# Altium schematic symbol library LATTICEPLDS_Library.SchLib: 291 symbols (part 27 of 32) (continued)
## LFSC/M25-F900/FN900 (continued)
part E pins: AB16 VCCIO4 (power), AB17 VCCIO4 (power), AB18 VCCIO4 (power), AB19 VCCIO4 (power), AB20 VCCIO4 (power), AC17 VCCAUX4 (power), AC18 VCCAUX4 (power), AC19 VCCAUX4 (power), AC20 VCCIO4 (power), AC21 VCCIO4 (power), AC22 VCCIO4 (power), AD17 VCCAUX4 (power), AD18 VCCAUX4 (power), AD19 VCCAUX4 (power), AD20 VCCIO4 (power), AD21 VCCIO4 (power), AD22 VCCIO4 (power), AD23 PB57A, AD24 VTT_4, AD25 PB68D, AE16 PB38C, AE17 VTT_4, AE18 VTT_4, AE19 PB52C, AE20 PB52D, AE21 PB53A, AE22 PB60C, AE23 PB57B, AE24 PB67C, AE25 PB67D, AE26 PB68C, AF16 PB38D, AF17 PB42C, AF18 PB47A, AF19 PB49D, AF21 PB53B, AF24 PB63A, AF25 PB64B, AF27 PB65B, AG16 PB39B, AG17 PB42D, AG18 PB47B, AG19 PB49C, AG20 VCCIO4 (power), AG21 PB55A, AG22 PB55B, AG23 VCCIO4 (power), AG24 PB63B, AG25 PB64A, AG26 PB65A, AG28 PB69C, AG29 PB69D, AH16 PB39A, AH17 PB42A, AH18 PB42B, AH19 PB51C, AH20 PB51D, AH21 PB56C, AH22 PB56A, AH23 PB56B, AH24 PB59A, AH25 PB59B, AH26 PB61A, AH27 PB61B, AH28 PB67B, AH29 PB68B, AH30 PB69B, AJ16 PB38A, AJ17 PB38B, AJ18 PB43A, AJ19 PB43B, AJ20 PB49A, AJ21 PB49B, AJ23 VCCIO4 (power), AJ26 VCCIO4 (power), AJ28 PB67A, AJ29 PB68A, AJ30 PB69A, AK16 PB37A, AK17 PB37B, AK18 PB41A, AK19 PB41B, AK20 PB46A, AK21 PB46B, AK22 PB51A, AK23 PB51B, AK24 PB52A, AK25 PB52B, AK28 PB60A, AK29 PB60B
part F pins: AB11 VCCIO5 (power), AB12 VCCIO5 (power), AB13 VCCIO5 (power), AB14 VCCIO5 (power), AB15 VCCIO5 (power), AC9 VCCIO5 (power), AC10 VCCIO5 (power), AC11 VCCIO5 (power), AC12 VCCAUX5 (power), AC13 VCCAUX5 (power), AC14 VCCAUX5 (power), AC15 VTT_5, AD6 PB4C, AD7 PB5C, AD8 PB5D, AD9 VCCIO5 (power), AD10 VCCIO5 (power), AD11 VCCIO5 (power), AD12 VCCAUX5 (power), AD13 VCCAUX5 (power), AD14 VCCAUX5 (power), AD15 PB31C, AD16 VTT_5, AE5 PB3D, AE7 VCCIO5 (power), AE9 VTT_5, AE10 PB11D, AE11 PB13A, AE12 PB15C, AE13 PB15D, AE14 PB20D, AE15 PB31D, AF4 PB3C, AF6 PB7B, AF7 PB7A, AF8 PB9A, AF9 PB11C, AF10 PB13B, AF13 PB20C, AF14 PB21C, AF15 PB21D, AG3 PB4A, AG5 PB8B, AG8 PB9B, AG11 VCCIO5 (power), AG13 PB23C, AG14 PB25B, AG15 PB29B, AH1 PB3A, AH2 PB4B, AH3 PB11A, AH4 PB8A, AH6 VCCIO5 (power), AH7 PB15A, AH8 PB15B, AH10 PB20A, AH11 PB20B, AH12 PB31A, AH13 PB23D, AH14 PB25A, AH15 PB29A, AJ1 PB3B, AJ2 PB5A, AJ3 PB11B, AJ4 PB12B, AJ5 PB17A, AJ6 PB17B, AJ7 PB19A, AJ8 PB19B, AJ9 VCCIO5 (power), AJ11 PB23A, AJ12 PB23B, AJ13 PB31B, AJ14 PB33A, AJ15 PB33B, AK2 PB5B, AK3 PB12A, AK4 PB16A, AK5 PB16B, AK6 PB21A, AK7 PB21B, AK8 PB24A, AK9 PB24B, AK10 PB28A, AK11 PB28B, AK12 PB32A, AK13 PB32B, AK14 PB35A, AK15 PB35B
part G pins: AA1 PL44B, AA2 PL47B, AA4 VCCIO6 (power), AA6 VTT_6, AA7 VCCIO6 (power), AA8 VCCIO6 (power), AB1 PL48A, AB2 VCCIO6 (power), AB5 PL51D, AB6 PL55C, AB7 VCCIO6 (power), AB8 VCCIO6 (power), AC1 PL48B, AC3 PL52A, AC4 PL53A, AC5 PL55D, AC6 PL57C, AC7 PL57D, AD1 VCCIO6 (power), AD2 PL51A, AD3 PL52B, AD4 PL53B, AD5 TEMP, AE2 PL51B, AE3 PL56A, AE4 XRES, AF1 PL55A, AF2 PL57A, AF3 PL56B, AG1 PL55B, AG2 PL57B, N1 PL29B, N2 PL29A, N3 PL30A, P1 PL34A, P2 PL31A, P3 PL30B, P4 PL30C, R1 PL34B, R2 PL31B, R3 PL31D, R4 PL34D, R5 PL34C, R6 PL29D, R7 PL29C, T1 PL38A, T2 PL35A, T3 PL31C, T4 PL39B, T5 PL39A, T6 PL35C, T7 VTT_6, T9 VCCIO6 (power), U1 PL38B, U2 PL35B, U3 PL36A, U4 PL40A, U5 PL40B, U6 PL42C, U7 VCCAUX6 (power), U8 VCCAUX6 (power), U9 VCCIO6 (power), V1 PL42A, V2 PL43A, V3 PL36B, V4 PL43D, V5 PL43C, V6 PL42D, V7 VCCAUX6 (power), V8 VCCAUX6 (power), V9 VCCIO6 (power), W1 PL42B, W2 PL43B, W3 PL47D, W4 VCCIO6 (power), W5 PL48C, W6 VTT_6, W7 VCCAUX6 (power), W8 VCCAUX6 (power), W9 VCCIO6 (power), Y1 PL44A, Y2 PL47A, Y3 PL47C, Y5 PL49A, Y6 PL49B, Y7 VCCIO6 (power), Y8 VCCIO6 (power), Y9 VCCIO6 (power)
part H pins: D1 PL22D, D2 PL16B, D3 PL16A, E1 PL22C, E2 PL17B, E3 PL17A, F1 PL22B, F2 PL22A, F3 PL18A, G1 PL20B, G2 PL20A, G3 PL18B, H2 VCCIO7 (power), H4 VCCIO7 (power), J1 PL26A, J2 VCCIO7 (power), J4 PL17D, J5 PL16D, J6 PL16C, J7 VCCIO7 (power), J8 VCCIO7 (power), K1 PL26B, K3 PL25A, K4 PL17C, K5 PL18C, K6 PL18D, K7 VCCIO7 (power), K8 VCCIO7 (power), L1 PL27A, L2 VCCIO7 (power), L3 PL25B, L5 PL21A, L6 PL25C, L7 VTT_7, L8 VCCIO7 (power), L9 VCCIO7 (power), M1 PL27B, M5 PL21B, M6 PL25D, M7 VCCAUX7 (power), M8 VCCAUX7 (power), M9 VCCIO7 (power), N4 VCCIO7 (power), N6 VCCIO7 (power), N7 VCCAUX7 (power), N8 VCCAUX7 (power), N9 VCCIO7 (power), P7 VTT_7, P8 PL27C, P9 VCCIO7 (power), R8 PL27D, R9 VCCIO7 (power)
part I pins: G24 TDI, G25 TCK, H25 TDO, J25 VCCJ (power), J26 TMS
part J pins: A2 RESP_ULC, A3 A_HDOUTP0_L, A4 A_HDOUTN0_L, A5 A_HDOUTN1_L, A6 A_HDOUTP1_L, A7 A_HDOUTP2_L, A8 A_HDOUTN2_L, A9 A_HDOUTN3_L, A10 A_HDOUTP3_L, B1 A_REFCLKP_L, B3 A_HDINP0_L, B4 A_HDINN0_L, B5 A_HDINN1_L, B6 A_HDINP1_L, B7 A_HDINP2_L, B8 A_HDINN2_L, B9 A_HDINN3_L, B10 A_HDINP3_L, C1 A_REFCLKN_L, C2 RESPN_ULC, C3 A_VDDIB0_L, C4 A_VDDOB0_L, C5 A_VDDOB1_L, C6 A_VDDIB1_L, C7 A_VDDIB2_L, C8 A_VDDOB2_L, C9 A_VDDOB3_L, C10 A_VDDIB3_L, D6 A_VDDRX0_L, D8 A_VDDRX2_L, E7 A_VDDRX1_L, E9 A_VDDRX3_L, F7 A_VDDAX25_L
part K pins: A1 GND (power), A11 UNUSED, A12 GND (power), A30 GND (power), AA3 GND (power), AA5 GND (power), AA9 VCC (power), AA10 VCC (power), AA11 VCC (power), AA12 VCC (power), AA13 VCC (power), AA14 VCC (power), AA15 GND (power), AA16 GND (power), AA17 VCC (power), AA18 VCC (power), AA19 VCC (power), AA20 VCC (power), AA21 VCC (power), AA22 VCC (power), AA27 GND (power), AA28 UNUSED, AB3 UNUSED, AB4 GND (power), AB9 VCC12 (power), AB10 VCC (power), AB21 VCC (power), AB22 VCC12 (power), AB29 GND (power), AB30 UNUSED, AC2 GND (power), AC8 VCC12 (power), AC16 UNUSED, AC23 VCC12 (power), AC30 GND (power), AE1 GND (power), AE6 GND (power), AE8 GND (power), AE27 GND (power), AF5 VCC12 (power), AF11 GND (power), AF12 UNUSED, AF20 GND (power), AF22 GND (power), AF23 GND (power), AF26 VCC12 (power), AG4 VCC12 (power), AG6 GND (power), AG7 UNUSED, AG9 GND (power), AG10 UNUSED, AG12 GND (power), AG27 VCC12 (power), AH5 GND (power), AH9 UNUSED, AJ10 GND (power), AJ22 GND (power), AJ24 UNUSED, AJ25 GND (power), AJ27 GND (power), AK1 GND (power), AK26 GND (power), AK27 UNUSED, AK30 GND (power), B2 UNUSED, B29 UNUSED, C11 GND (power), C20 GND (power), D4 VCC12 (power), D5 VCC12 (power), D7 VCC12 (power), D9 VCC12 (power), D10 GND (power), D11 GND (power), D20 GND (power), D21 GND (power), D22 VCC12 (power), D24 VCC12 (power), D26 VCC12 (power), D27 VCC12 (power), E5 VCC12 (power), E6 VCC12 (power), E8 VCC12 (power), E10 GND (power), E11 GND (power), E18 GND (power), E19 UNUSED, E20 GND (power), E21 GND (power), E23 VCC12 (power), E25 VCC12 (power), E26 VCC12 (power), E27 GND (power), F8 GND (power), F9 UNUSED, F10 GND (power), F21 GND (power), F23 GND (power), F27 GND (power), F30 GND (power), G4 GND (power), G7 UNUSED, G8 GND (power), G19 UNUSED, G20 UNUSED, G21 UNUSED, G23 GND (power), H1 GND (power), H3 GND (power), H7 GND (power), H8 VCC12 (power), H15 VCC12 (power), H23 VCC12 (power), H29 GND (power), J3 UNUSED, J9 VCC (power), J10 VCC (power), J21 VCC (power), J22 VCC (power), J27 GND (power), K2 GND (power), K9 VCC (power), K10 VCC (power), K11 VCC (power), K12 VCC (power), K13 VCC (power), K14 VCC (power), K15 GND (power), K16 GND (power), K17 VCC (power), K18 VCC (power), K19 VCC (power), K20 VCC (power), K21 VCC (power), K22 VCC (power), K28 UNUSED, K29 GND (power), L4 GND (power), L10 VCC (power), L11 GND (power), L12 GND (power), L13 GND (power), L14 GND (power), L15 GND (power), L16 GND (power), L17 GND (power), L18 GND (power), L19 GND (power), L20 GND (power), L21 VCC (power), L28 UNUSED, M2 GND (power), M3 GND (power), M4 UNUSED, M10 VCC (power), M11 GND (power), M12 GND (power), M13 GND (power), M14 GND (power), M15 GND (power), M16 GND (power), M17 GND (power), M18 GND (power), M19 GND (power), M20 GND (power), M21 VCC (power), M28 GND (power), N5 GND (power), N10 VCC (power), N11 GND (power), N12 GND (power), N13 GND (power), N14 GND (power), N15 GND (power), N16 GND (power), N17 GND (power), N18 GND (power), N19 GND (power), N20 GND (power), N21 VCC (power), N26 GND (power), P5 UNUSED, P6 GND (power), P10 VCC (power), P11 GND (power), P12 GND (power), P13 GND (power), P14 GND (power), P15 GND (power), P16 GND (power), P17 GND (power), P18 GND (power), P19 GND (power), P20 GND (power), P21 VCC (power), P23 UNUSED, P24 UNUSED, P25 GND (power), R10 GND (power), R11 GND (power), R12 GND (power), R13 GND (power), R14 GND (power), R15 GND (power), R16 GND (power), R17 GND (power), R18 GND (power), R19 GND (power), R20 GND (power), R21 GND (power), R23 VCC12 (power), R24 GND (power), T8 VCC12 (power), T10 GND (power), T11 GND (power), T12 GND (power), T13 GND (power), T14 GND (power), T15 GND (power), T16 GND (power), T17 GND (power), T18 GND (power), T19 GND (power), T20 GND (power), T21 GND (power), U10 VCC (power), U11 GND (power), U12 GND (power), U13 GND (power), U14 GND (power), U15 GND (power), U16 GND (power), U17 GND (power), U18 GND (power), U19 GND (power), U20 GND (power), U21 VCC (power), V10 VCC (power), V11 GND (power), V12 GND (power), V13 GND (power), V14 GND (power), V15 GND (power), V16 GND (power), V17 GND (power), V18 GND (power), V19 GND (power), V20 GND (power), V21 VCC (power), W10 VCC (power), W11 GND (power), W12 GND (power), W13 GND (power), W14 GND (power), W15 GND (power), W16 GND (power), W17 GND (power), W18 GND (power), W19 GND (power), W20 GND (power), W21 VCC (power), Y4 GND (power), Y10 VCC (power), Y11 GND (power), Y12 GND (power), Y13 GND (power), Y14 GND (power), Y15 GND (power), Y16 GND (power), Y17 GND (power), Y18 GND (power), Y19 GND (power), Y20 GND (power), Y21 VCC (power), Y26 GND (power), Y29 GND (power)

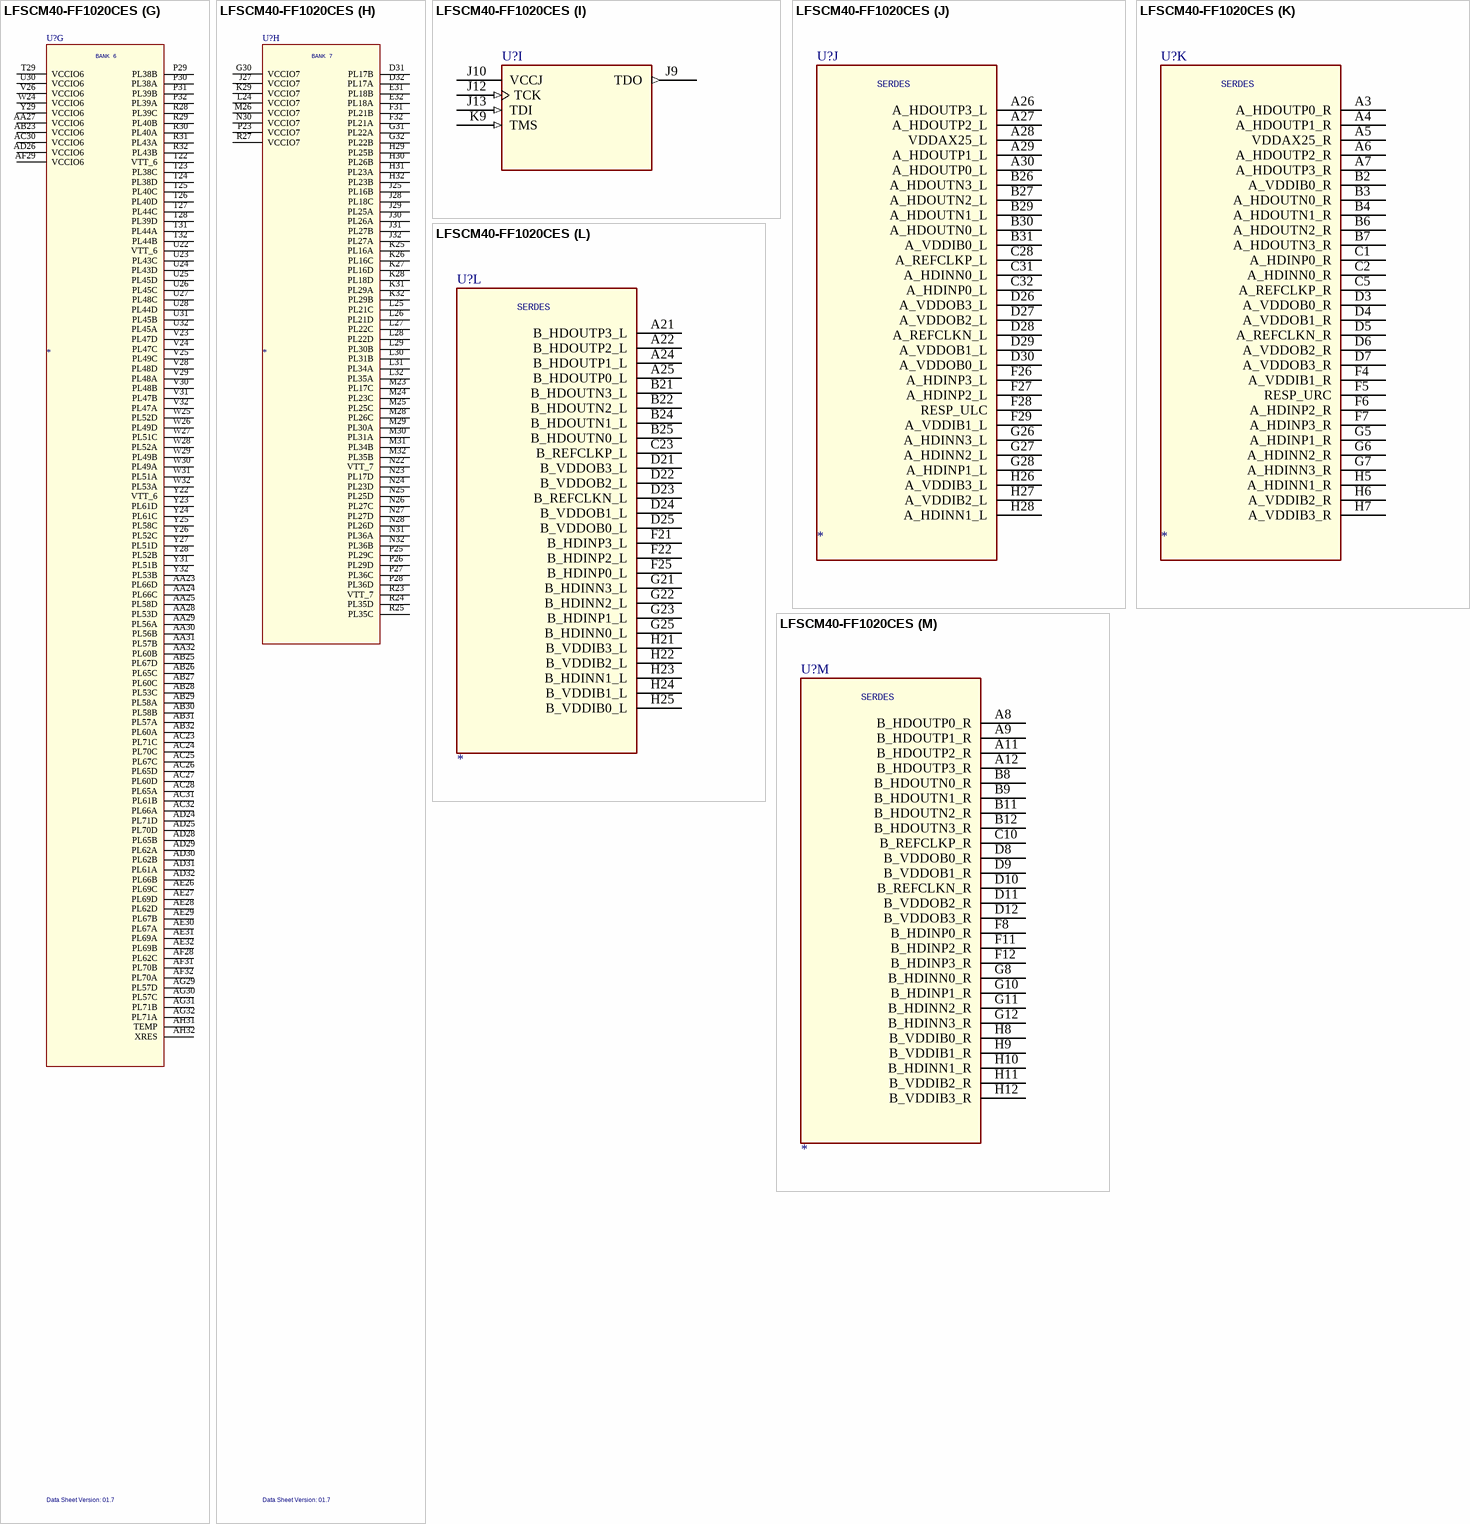
[diagram p248: symbol LFSCM40-FF1020CES]

## LFSCM40-FF1020CES
designator U?  Data Sheet Version: 01.7
SPLIT_INST: TRUE; SWAP_INFO: (S1+S2+S3+S4+S5+S6+S7+S8+S9+S10+S11+S12+S13)
part A pins: A2 GND (power), A10 GND (power), A23 GND (power), A31 GND (power), AA6 GND (power), AA11 VCCAUX (power), AA12 VCCAUX (power), AA13 GND (power), AA14 VCC12 (power), AA15 GND (power), AA16 VCC12 (power), AA17 VCC12 (power), AA18 GND (power), AA19 VCC12 (power), AA20 GND (power), AA21 VCCAUX (power), AA22 VCCAUX (power), AA26 GND (power), AB10 GND (power), AB11 VCCAUX (power), AB12 VCCAUX (power), AB15 VCCAUX (power), AB16 VCCAUX (power), AB17 VCCAUX (power), AB18 VCCAUX (power), AB21 VCCAUX (power), AB22 VCCAUX (power), AB24 GND (power), AC3 GND (power), AC14 GND (power), AC22 GND (power), AC29 GND (power), AD7 GND (power), AD11 GND (power), AD19 GND (power), AD27 GND (power), AF4 GND (power), AF12 GND (power), AF18 GND (power), AF24 GND (power), AF30 GND (power), AG9 GND (power), AG15 GND (power), AG21 GND (power), AJ4 GND (power), AJ10 GND (power), AJ16 GND (power), AJ20 GND (power), AJ26 GND (power), AJ29 GND (power), AK7 GND (power), AK13 GND (power), AK17 GND (power), AK23 GND (power), AL1 GND (power), AL32 GND (power), AM2 GND (power), AM31 GND (power), B1 GND (power), B5 VCC12 (power), B10 VCC12 (power), B23 VCC12 (power), B28 VCC12 (power), B32 GND (power), C3 GND (power), C4 GND (power), C6 GND (power), C7 GND (power), C8 GND (power), C9 GND (power), C11 GND (power), C12 GND (power), C16 GND (power), C21 GND (power), C22 GND (power), C24 GND (power), C25 GND (power), C26 GND (power), C27 GND (power), C29 GND (power), C30 GND (power), D17 GND (power), E4 VCC12 (power), E5 UNUSED, E7 VCC12 (power), E9 VCC12 (power), E10 UNUSED, E12 VCC12 (power), E21 VCC12 (power), E23 UNUSED, E24 VCC12 (power), E26 VCC12 (power), E28 UNUSED, E29 VCC12 (power), F3 GND (power), F9 GND (power), F10 UNUSED, F18 GND (power), F23 UNUSED, F30 GND (power), G3 GND (power), G15 GND (power), G24 GND (power), G29 GND (power), J6 GND (power), J14 GND (power), J22 GND (power), J26 GND (power), K4 GND (power), K11 GND (power), K19 GND (power), K30 GND (power), L9 GND (power), L11 VCCAUX (power), L12 VCCAUX (power), L14 VCCAUX (power), L15 VCCAUX (power), L18 VCCAUX (power), L19 VCCAUX (power), L21 VCCAUX (power), L22 VCCAUX (power), L23 GND (power), M7 GND (power), M11 VCCAUX (power), M12 VCCAUX (power), M13 GND (power), M14 VCC12 (power), M15 GND (power), M16 VCC12 (power), M17 VCC12 (power), M18 GND (power), M19 VCC12 (power), M20 GND (power), M21 VCCAUX (power), M22 VCCAUX (power), M27 GND (power), N3 GND (power), N12 GND (power), N13 VCC (power), N14 GND (power), N15 VCC (power), N16 VCC (power), N17 VCC (power), N18 VCC (power), N19 GND (power), N20 VCC (power), N21 GND (power), N29 GND (power), P10 GND (power), P11 VCCAUX (power), P12 VCC12 (power), P13 GND (power), P14 VCC (power), P15 GND (power), P16 VCC (power), P17 VCC (power), P18 GND (power), P19 VCC (power), P20 GND (power), P21 VCC12 (power), P22 VCCAUX (power), P24 GND (power), R6 GND (power), R11 VCCAUX (power), R12 GND (power), R13 VCC (power), R14 GND (power), R15 VCC (power), R16 GND (power), R17 GND (power), R18 VCC (power), R19 GND (power), R20 VCC (power), R21 GND (power), R22 VCCAUX (power), R26 GND (power), T4 GND (power), T12 VCC12 (power), T13 VCC (power), T14 VCC (power), T15 GND (power), T16 VCC (power), T17 VCC (power), T18 GND (power), T19 VCC (power), T20 VCC (power), T21 VCC12 (power), T30 GND (power), U3 GND (power), U12 VCC12 (power), U13 VCC (power), U14 VCC (power), U15 GND (power), U16 VCC (power), U17 VCC (power), U18 GND (power), U19 VCC (power), U20 VCC (power), U21 VCC12 (power), U29 GND (power), V7 GND (power), V11 VCCAUX (power), V12 GND (power), V13 VCC (power), V14 GND (power), V15 VCC (power), V16 GND (power), V17 GND (power), V18 VCC (power), V19 GND (power), V20 VCC (power), V21 GND (power), V22 VCCAUX (power), V27 GND (power), W9 GND (power), W11 VCCAUX (power), W12 VCC12 (power), W13 GND (power), W14 VCC (power), W15 GND (power), W16 VCC (power), W17 VCC (power), W18 GND (power), W19 VCC (power), W20 GND (power), W21 VCC12 (power), W22 VCCAUX (power), W23 GND (power), Y4 GND (power), Y12 GND (power), Y13 VCC (power), Y14 GND (power), Y15 VCC (power), Y16 VCC (power), Y17 VCC (power), Y18 VCC (power), Y19 GND (power), Y20 VCC (power), Y21 GND (power), Y30 GND (power)
part B pins: A13 PT47A, A14 PT47B, A15 PT45A, A16 PT45B, A17 PT43B, A18 PT43A, A19 PT41B, A20 PT41A, B13 PT51A, B14 PT51B, B15 PT46A, B16 PT46B, B17 PT42B, B18 PT42A, B19 PT37B, B20 PT37A, C13 PT53B, C14 PT53A, C15 PT50B, C17 VCCIO1 (power), C18 PT38B, C19 PT35A, C20 PT35B, D13 PT55B, D14 PT55A, D15 PT50A, D16 VCCIO1 (power), D18 PT38A, D19 PT33A, D20 PT33B, E3 A_VDDRX01_R, E6 A_VDDRX23_R, E8 B_VDDRX01_R, E11 B_VDDRX23_R, E13 PT59B, E14 PT57B, E15 PT54D, E16 PT54C, E17 PT35D, E18 PT35C, E19 PT30B, E20 PT27B, E22 B_VDDRX23_L, E25 B_VDDRX01_L, E27 A_VDDRX23_L, E30 A_VDDRX01_L, F13 PT59A, F14 PT57A, F15 VCCIO1 (power), F16 PT46C, F17 PT42D, F19 PT30A, F20 PT27A, F24 VCCIO1 (power), G9 VCCIO1 (power), G13 PT58C, G14 PT55C, G16 PT46D, G17 PT42C, G18 VCCIO1 (power), G19 PT33C, G20 PT30C, H13 PT58D, H14 PT55D, H15 PT47D, H16 PT47C, H17 PT41D, H18 PT41C, H19 PT33D, H20 PT30D, J11 VCCIO1 (power), J15 PT61D, J16 PT49B, J17 PT39B, J18 PT28D, J19 VCCIO1 (power), J20 RDCFGN, J21 RESETN, J23 M1, J24 M2, K10 CCLK, K12 PROGRAMN, K13 MPIIRQN, K14 VCCIO1 (power), K15 PT61C, K16 PT49A, K17 PT39A, K18 PT28C, K20 DONE, K21 INITN, K22 VCCIO1 (power), K23 M0, K24 M3, L13 PT50D, L16 PT45C, L17 PT43C, L20 PT39C
part C pins: D1 PR17A, D2 PR17B, E1 PR18A, E2 PR18B, F1 PR21A, F2 PR21B, G1 PR22B, G2 PR22A, G4 VCCIO2 (power), H1 PR23B, H2 PR23A, H3 PR26B, H4 PR25B, J1 PR27A, J2 PR27B, J3 PR26A, J4 PR25A, J5 PR18C, J7 VCCIO2 (power), J8 PR16B, K1 PR29B, K2 PR29A, K3 VCCIO2 (power), K5 PR18D, K6 PR16D, K7 PR16C, K8 PR16A, L1 PR35A, L2 PR34A, L3 PR31B, L4 PR30B, L5 PR22D, L6 PR22C, L7 PR21D, L8 PR21C, L10 VCCIO2 (power), M1 PR35B, M2 PR34B, M3 PR31A, M4 PR30A, M5 PR26C, M6 VCCIO2 (power), M8 PR25C, M9 PR23C, M10 PR17C, N1 PR36B, N2 PR36A, N4 VCCIO2 (power), N5 PR26D, N6 PR27D, N7 PR27C, N8 PR25D, N9 PR23D, N10 PR17D, N11 VTT_2, P5 PR36D, P6 PR36C, P7 PR29D, P8 PR29C, P9 VCCIO2 (power), R7 VCCIO2 (power), R8 PR35C, R9 PR35D, R10 VTT_2
part D pins: AA1 PR60B, AA2 PR57B, AA3 PR56B, AA4 PR56A, AA5 PR53D, AA7 VCCIO3 (power), AA8 PR58D, AA9 PR66C, AA10 PR66D, AB1 PR60A, AB2 PR57A, AB3 PR58B, AB4 PR58A, AB5 PR53C, AB6 PR60C, AB7 PR65C, AB8 PR67D, AB9 VCCIO3 (power), AC1 PR66A, AC2 PR61B, AC4 VCCIO3 (power), AC5 PR65A, AC6 PR60D, AC7 PR65D, AC8 PR67C, AC9 PR70C, AC10 PR71C, AD1 PR66B, AD2 PR61A, AD3 PR62B, AD4 PR62A, AD5 PR65B, AD6 VCCIO3 (power), AD8 PR70D, AD9 PR71D, AE1 PR69B, AE2 PR69A, AE3 PR67A, AE4 PR67B, AE5 PR62D, AE6 PR69D, AE7 PR69C, AF1 PR70A, AF2 PR70B, AF3 VCCIO3 (power), AF5 PR62C, AG1 PR71A, AG2 PR71B, AG3 PR57C, AG4 PR57D, AH1 PROBE_VCC (power), AH2 PROBE_GND, P1 PR39A, P2 PR39B, P3 PR38A, P4 PR38B, R1 PR43B, R2 PR43A, R3 PR40A, R4 PR40B, R5 PR39C, T1 PR44B, T2 PR44A, T3 VCCIO3 (power), T5 PR39D, T6 PR44C, T7 PR40D, T8 PR40C, T9 PR38D, T10 PR38C, T11 VTT_3, U1 PR45A, U2 PR45B, U4 VCCIO3 (power), U5 PR44D, U6 PR48C, U7 PR45C, U8 PR45D, U9 PR43D, U10 PR43C, U11 VTT_3, V1 PR47A, V2 PR47B, V3 PR48B, V4 PR48A, V5 PR48D, V6 VCCIO3 (power), V8 PR49C, V9 PR47C, V10 PR47D, W1 PR53A, W2 PR51A, W3 PR49A, W4 PR49B, W5 PR52A, W6 PR51C, W7 PR49D, W8 PR52D, W10 VCCIO3 (power), Y1 PR53B, Y2 PR51B, Y3 VCCIO3 (power), Y5 PR52B, Y6 PR51D, Y7 PR52C, Y8 PR58C, Y9 PR61C, Y10 PR61D, Y11 VTT_3
part E pins: AB13 VTT_4, AB14 VTT_4, AC11 VCCIO4 (power), AC12 PB70C, AC13 PB66D, AC15 VTT_4, AC16 PB46D, AD10 PB82D, AD12 PB69A, AD13 PB66C, AD14 VCCIO4 (power), AD15 PB51D, AD16 PB46C, AE8 PB83D, AE9 PB83C, AE10 PB82C, AE11 PB75D, AE12 PB69B, AE13 PB61D, AE14 PB55D, AE15 PB51C, AE16 PB45D, AF6 PB81D, AF7 PB79D, AF8 PB79C, AF9 VCCIO4 (power), AF10 PB75C, AF11 PB67C, AF13 PB61C, AF14 PB55C, AF15 VCCIO4 (power), AF16 PB45C, AG5 PB81C, AG6 PB62C, AG7 PB74A, AG8 PB74B, AG10 PB63C, AG11 PB63D, AG12 VCCIO4 (power), AG13 PB53D, AG14 PB53C, AG16 PB47C, AH3 PB85D, AH4 PB78B, AH5 PB78A, AH6 PB58D, AH7 PB58C, AH8 PB57D, AH9 PB57C, AH10 PB54D, AH11 PB54C, AH12 PB50D, AH13 PB50C, AH14 PB49D, AH15 PB49C, AH16 PB47D, AJ1 PB85A, AJ2 PB85C, AJ3 PB82B, AJ5 PB79B, AJ6 PB75B, AJ7 VCCIO4 (power), AJ8 PB67B, AJ9 PB63B, AJ11 PB58B, AJ12 PB55B, AJ13 VCCIO4 (power), AJ14 PB51B, AJ15 PB49B, AK1 PB85B, AK2 PB83B, AK3 PB82A, AK4 VCCIO4 (power), AK5 PB79A, AK6 PB75A, AK8 PB67A, AK9 PB63A, AK10 VCCIO4 (power), AK11 PB58A, AK12 PB55A, AK14 PB51A, AK15 PB49A, AK16 VCCIO4 (power), AL2 PB83A, AL3 PB81B, AL4 PB81A, AL5 PB73B, AL6 PB73A, AL7 PB66B, AL8 PB62B, AL9 PB62A, AL10 PB57B, AL11 PB57A, AL12 PB53B, AL13 PB53A, AL14 PB47B, AL15 PB46B, AL16 PB45B, AM3 PB77B, AM4 PB77A, AM5 PB70B, AM6 PB70A, AM7 PB66A, AM8 PB61B, AM9 PB61A, AM10 PB54B, AM11 PB54A, AM12 PB50B, AM13 PB50A, AM14 PB47A, AM15 PB46A, AM16 PB45A
part F pins: AB19 VTT_5, AB20 VTT_5, AC17 PB42C, AC18 VTT_5, AC19 VCCIO5 (power), AC20 PB22C, AC21 PB15C, AD17 PB42D, AD18 PB37C, AD20 PB22D, AD21 PB15D, AD22 VCCIO5 (power), AD23 PB5C, AE17 PB43C, AE18 PB37D, AE19 PB33C, AE20 PB25D, AE21 PB25C, AE22 PB13C, AE23 PB5D, AE24 PB4D, AE25 PB4C, AF17 PB43D, AF19 PB33D, AF20 PB27C, AF21 VCCIO5 (power), AF22 PB17D, AF23 PB13D, AF25 PB7D, AF26 PB7C, AF27 PB3C, AG17 PB41D, AG18 VCCIO5 (power), AG19 PB35D, AG20 PB35C, AG22 PB30C, AG23 PB17C, AG24 VCCIO5 (power), AG25 PB19B, AG26 PB19A, AG27 PB26C, AG28 PB3D, AH17 PB41C, AH18 PB39D, AH19 PB39C, AH20 PB38D, AH21 PB38C, AH22 PB30D, AH23 PB31C, AH24 PB31D, AH25 PB34C, AH26 PB34D, AH27 PB26D, AH28 PB11D, AH29 PB11C, AH30 PB9B, AJ17 VCCIO5 (power), AJ18 PB39A, AJ19 PB37A, AJ21 PB33A, AJ22 PB30A, AJ23 VCCIO5 (power), AJ24 PB25A, AJ25 PB21A, AJ27 PB13A, AJ28 PB8A, AJ30 VCCIO5 (power), AJ31 PB9A, AJ32 PB3A, AK18 PB39B, AK19 PB37B, AK20 VCCIO5 (power), AK21 PB33B, AK22 PB30B, AK24 PB25B, AK25 PB21B, AK26 VCCIO5 (power), AK27 PB13B, AK28 PB8B, AK29 PB7A, AK30 PB5A, AK31 PB4A, AK32 PB3B, AL17 PB43A, AL18 PB42A, AL19 PB41A, AL20 PB35B, AL21 PB35A, AL22 PB31B, AL23 PB31A, AL24 PB26B, AL25 PB26A, AL26 PB22A, AL27 PB15B, AL28 PB15A, AL29 PB7B, AL30 PB5B, AL31 PB4B, AM17 PB43B, AM18 PB42B, AM19 PB41B, AM20 PB38B, AM21 PB38A, AM22 PB34B, AM23 PB34A, AM24 PB27B, AM25 PB27A, AM26 PB22B, AM27 PB17B, AM28 PB17A, AM29 PB11B, AM30 PB11A
part G pins: AA23 PL66D, AA24 PL66C, AA25 PL58D, AA27 VCCIO6 (power), AA28 PL53D, AA29 PL56A, AA30 PL56B, AA31 PL57B, AA32 PL60B, AB23 VCCIO6 (power), AB25 PL67D, AB26 PL65C, AB27 PL60C, AB28 PL53C, AB29 PL58A, AB30 PL58B, AB31 PL57A, AB32 PL60A, AC23 PL71C, AC24 PL70C, AC25 PL67C, AC26 PL65D, AC27 PL60D, AC28 PL65A, AC30 VCCIO6 (power), AC31 PL61B, AC32 PL66A, AD24 PL71D, AD25 PL70D, AD26 VCCIO6 (power), AD28 PL65B, AD29 PL62A, AD30 PL62B, AD31 PL61A, AD32 PL66B, AE26 PL69C, AE27 PL69D, AE28 PL62D, AE29 PL67B, AE30 PL67A, AE31 PL69A, AE32 PL69B, AF28 PL62C, AF29 VCCIO6 (power), AF31 PL70B, AF32 PL70A, AG29 PL57D, AG30 PL57C, AG31 PL71B, AG32 PL71A, AH31 TEMP, AH32 XRES, P29 PL38B, P30 PL38A, P31 PL39B, P32 PL39A, R28 PL39C, R29 PL40B, R30 PL40A, R31 PL43A, R32 PL43B, T22 VTT_6, T23 PL38C, T24 PL38D, T25 PL40C, T26 PL40D, T27 PL44C, T28 PL39D, T29 VCCIO6 (power), T31 PL44A, T32 PL44B, U22 VTT_6, U23 PL43C, U24 PL43D, U25 PL45D, U26 PL45C, U27 PL48C, U28 PL44D, U30 VCCIO6 (power), U31 PL45B, U32 PL45A, V23 PL47D, V24 PL47C, V25 PL49C, V26 VCCIO6 (power), V28 PL48D, V29 PL48A, V30 PL48B, V31 PL47B, V32 PL47A, W24 VCCIO6 (power), W25 PL52D, W26 PL49D, W27 PL51C, W28 PL52A, W29 PL49B, W30 PL49A, W31 PL51A, W32 PL53A, Y22 VTT_6, Y23 PL61D, Y24 PL61C, Y25 PL58C, Y26 PL52C, Y27 PL51D, Y28 PL52B, Y29 VCCIO6 (power), Y31 PL51B, Y32 PL53B
part H pins: D31 PL17B, D32 PL17A, E31 PL18B, E32 PL18A, F31 PL21B, F32 PL21A, G30 VCCIO7 (power), G31 PL22A, G32 PL22B, H29 PL25B, H30 PL26B, H31 PL23A, H32 PL23B, J25 PL16B, J27 VCCIO7 (power), J28 PL18C, J29 PL25A, J30 PL26A, J31 PL27B, J32 PL27A, K25 PL16A, K26 PL16C, K27 PL16D, K28 PL18D, K29 VCCIO7 (power), K31 PL29A, K32 PL29B, L24 VCCIO7 (power), L25 PL21C, L26 PL21D, L27 PL22C, L28 PL22D, L29 PL30B, L30 PL31B, L31 PL34A, L32 PL35A, M23 PL17C, M24 PL23C, M25 PL25C, M26 VCCIO7 (power), M28 PL26C, M29 PL30A, M30 PL31A, M31 PL34B, M32 PL35B, N22 VTT_7, N23 PL17D, N24 PL23D, N25 PL25D, N26 PL27C, N27 PL27D, N28 PL26D, N30 VCCIO7 (power), N31 PL36A, N32 PL36B, P23 VCCIO7 (power), P25 PL29C, P26 PL29D, P27 PL36C, P28 PL36D, R23 VTT_7, R24 PL35D, R25 PL35C, R27 VCCIO7 (power)
part I pins: J9 TDO (out), J10 VCCJ (power), J12 TCK (in), J13 TDI (in), K9 TMS (in)
part J pins: A26 A_HDOUTP3_L, A27 A_HDOUTP2_L, A28 VDDAX25_L, A29 A_HDOUTP1_L, A30 A_HDOUTP0_L, B26 A_HDOUTN3_L, B27 A_HDOUTN2_L, B29 A_HDOUTN1_L, B30 A_HDOUTN0_L, B31 A_VDDIB0_L, C28 A_REFCLKP_L, C31 A_HDINN0_L, C32 A_HDINP0_L, D26 A_VDDOB3_L, D27 A_VDDOB2_L, D28 A_REFCLKN_L, D29 A_VDDOB1_L, D30 A_VDDOB0_L, F26 A_HDINP3_L, F27 A_HDINP2_L, F28 RESP_ULC, F29 A_VDDIB1_L, G26 A_HDINN3_L, G27 A_HDINN2_L, G28 A_HDINP1_L, H26 A_VDDIB3_L, H27 A_VDDIB2_L, H28 A_HDINN1_L
part K pins: A3 A_HDOUTP0_R, A4 A_HDOUTP1_R, A5 VDDAX25_R, A6 A_HDOUTP2_R, A7 A_HDOUTP3_R, B2 A_VDDIB0_R, B3 A_HDOUTN0_R, B4 A_HDOUTN1_R, B6 A_HDOUTN2_R, B7 A_HDOUTN3_R, C1 A_HDINP0_R, C2 A_HDINN0_R, C5 A_REFCLKP_R, D3 A_VDDOB0_R, D4 A_VDDOB1_R, D5 A_REFCLKN_R, D6 A_VDDOB2_R, D7 A_VDDOB3_R, F4 A_VDDIB1_R, F5 RESP_URC, F6 A_HDINP2_R, F7 A_HDINP3_R, G5 A_HDINP1_R, G6 A_HDINN2_R, G7 A_HDINN3_R, H5 A_HDINN1_R, H6 A_VDDIB2_R, H7 A_VDDIB3_R
part L pins: A21 B_HDOUTP3_L, A22 B_HDOUTP2_L, A24 B_HDOUTP1_L, A25 B_HDOUTP0_L, B21 B_HDOUTN3_L, B22 B_HDOUTN2_L, B24 B_HDOUTN1_L, B25 B_HDOUTN0_L, C23 B_REFCLKP_L, D21 B_VDDOB3_L, D22 B_VDDOB2_L, D23 B_REFCLKN_L, D24 B_VDDOB1_L, D25 B_VDDOB0_L, F21 B_HDINP3_L, F22 B_HDINP2_L, F25 B_HDINP0_L, G21 B_HDINN3_L, G22 B_HDINN2_L, G23 B_HDINP1_L, G25 B_HDINN0_L, H21 B_VDDIB3_L, H22 B_VDDIB2_L, H23 B_HDINN1_L, H24 B_VDDIB1_L, H25 B_VDDIB0_L
part M pins: A8 B_HDOUTP0_R, A9 B_HDOUTP1_R, A11 B_HDOUTP2_R, A12 B_HDOUTP3_R, B8 B_HDOUTN0_R, B9 B_HDOUTN1_R, B11 B_HDOUTN2_R, B12 B_HDOUTN3_R, C10 B_REFCLKP_R, D8 B_VDDOB0_R, D9 B_VDDOB1_R, D10 B_REFCLKN_R, D11 B_VDDOB2_R, D12 B_VDDOB3_R, F8 B_HDINP0_R, F11 B_HDINP2_R, F12 B_HDINP3_R, G8 B_HDINN0_R, G10 B_HDINP1_R, G11 B_HDINN2_R, G12 B_HDINN3_R, H8 B_VDDIB0_R, H9 B_VDDIB1_R, H10 B_HDINN1_R, H11 B_VDDIB2_R, H12 B_VDDIB3_R
part A text: SUPPLIES
part B text: BANK 1
part C text: BANK 2
part D text: BANK 3
part E text: BANK 4
part F text: BANK 5
part G text: BANK 6
part H text: BANK 7
part J text: SERDES
part K text: SERDES
part L text: SERDES
part M text: SERDES

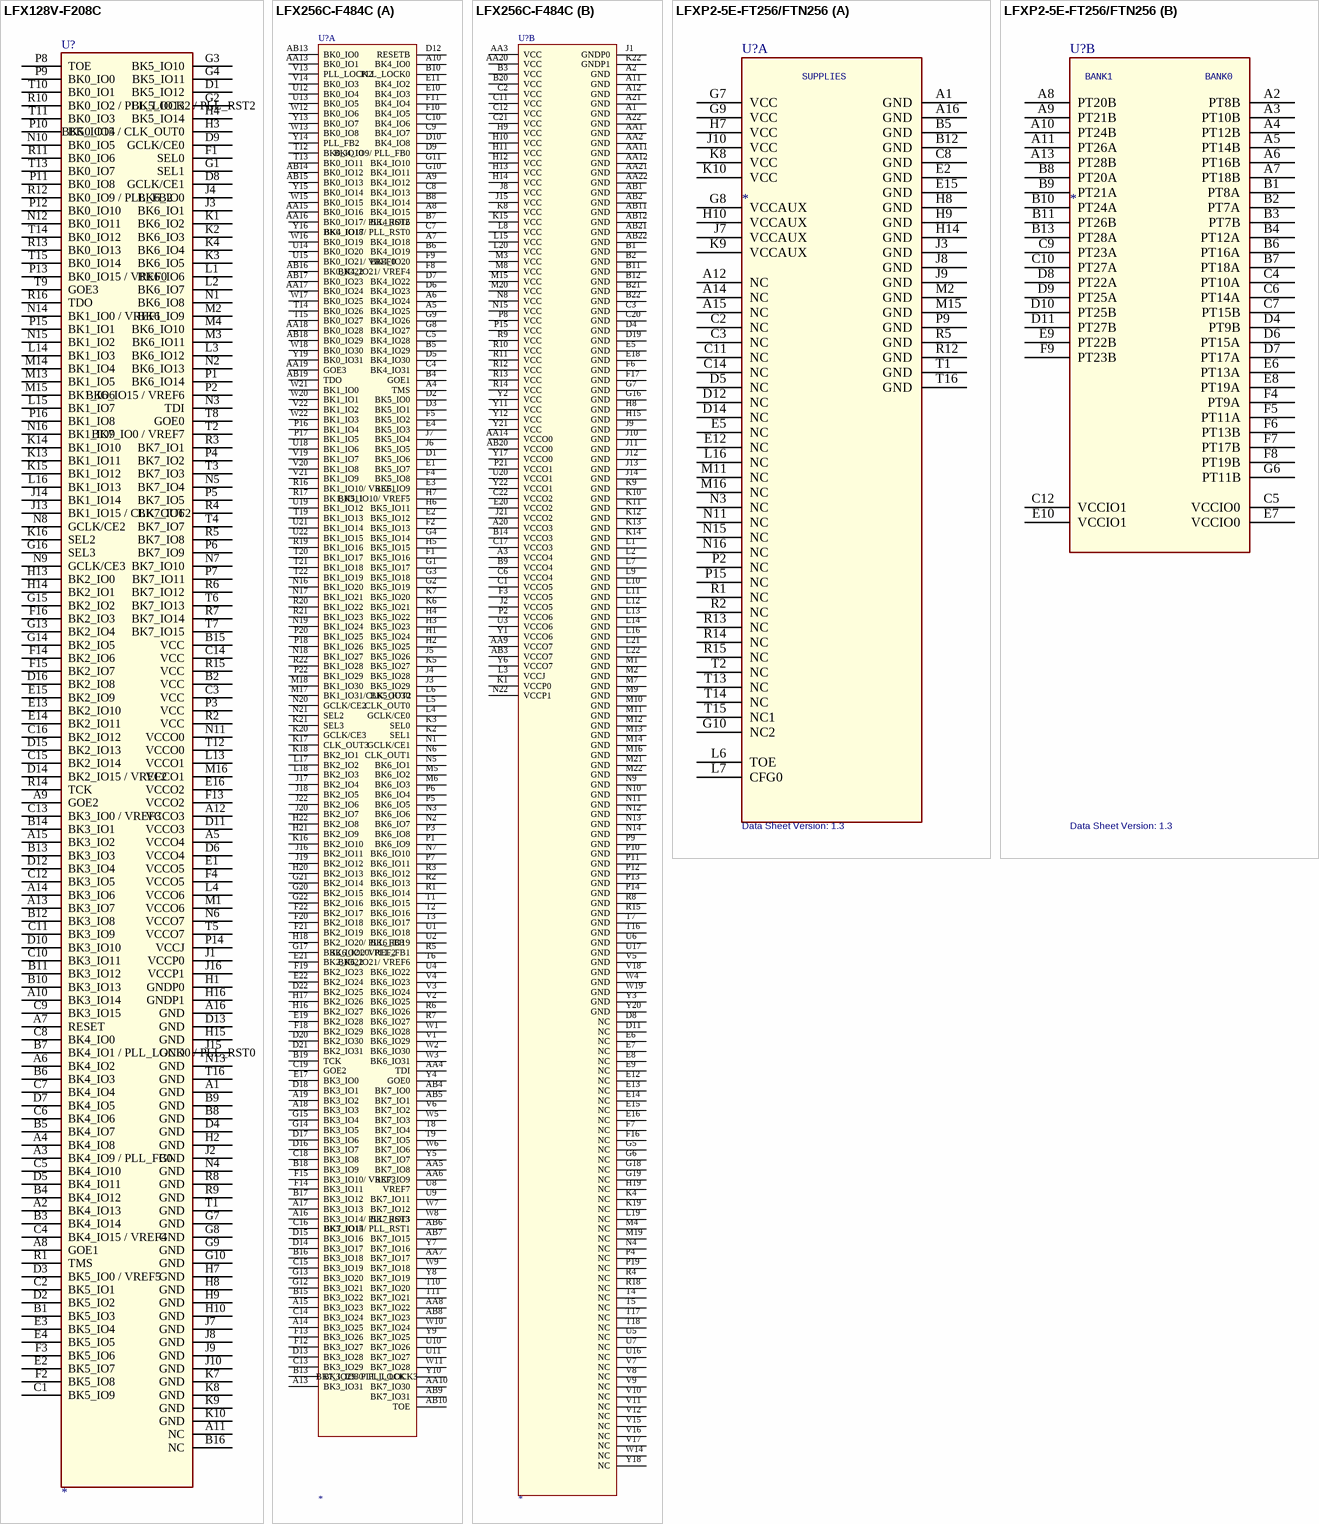
[diagram p249: symbols LFX128V-F208C to LFXP2-5E-FT256/FTN256]

## LFX128V-F208C
designator U?
pins: A1 GND (power), A2 BK4_IO13, A3 BK4_IO9 / PLL_FB0, A4 BK4_IO8, A5 VCCO4 (power), A6 BK4_IO2, A7 RESET, A8 GOE1, A9 GOE2, A10 BK3_IO14, A11 NC, A12 VCCO3 (power), A13 BK3_IO7, A14 BK3_IO6, A15 BK3_IO2, A16 GND (power), B1 BK5_IO3, B2 VCC (power), B3 BK4_IO14, B4 BK4_IO12, B5 BK4_IO7, B6 BK4_IO3, B7 BK4_IO1 / PLL_LOCK0 / PLL_RST0, B8 GND (power), B9 GND (power), B10 BK3_IO13, B11 BK3_IO12, B12 BK3_IO8, B13 BK3_IO3, B14 BK3_IO1, B15 VCC (power), B16 NC, C1 BK5_IO9, C2 BK5_IO1, C3 VCC (power), C4 BK4_IO15 / VREF4, C5 BK4_IO10, C6 BK4_IO6, C7 BK4_IO4, C8 BK4_IO0, C9 BK3_IO15, C10 BK3_IO11, C11 BK3_IO9, C12 BK3_IO5, C13 BK3_IO0 / VREF3, C14 VCC (power), C15 BK2_IO14, C16 BK2_IO12, D1 BK5_IO12, D2 BK5_IO2, D3 BK5_IO0 / VREF5, D4 GND (power), D5 BK4_IO11, D6 VCCO4 (power), D7 BK4_IO5, D8 GCLK/CE1, D9 GCLK/CE0, D10 BK3_IO10, D11 VCCO3 (power), D12 BK3_IO4, D13 GND (power), D14 BK2_IO15 / VREF2, D15 BK2_IO13, D16 BK2_IO8, E1 VCCO5 (power), E2 BK5_IO7, E3 BK5_IO4, E4 BK5_IO5, E13 BK2_IO10, E14 BK2_IO11, E15 BK2_IO9, E16 VCCO2 (power), F1 SEL0, F2 BK5_IO8, F3 BK5_IO6, F4 VCCO5 (power), F13 VCCO2 (power), F14 BK2_IO6, F15 BK2_IO7, F16 BK2_IO3, G1 SEL1, G2 BK5_IO13, G3 BK5_IO10, G4 BK5_IO11, G7 GND (power), G8 GND (power), G9 GND (power), G10 GND (power), G13 BK2_IO4, G14 BK2_IO5, G15 BK2_IO2, G16 SEL3, H1 GNDP0 (power), H2 GND (power), H3 BK5_IO15 / CLK_OUT0, H4 BK5_IO14, H7 GND (power), H8 GND (power), H9 GND (power), H10 GND (power), H13 BK2_IO0, H14 BK2_IO1, H15 GND (power), H16 GNDP1 (power), J1 VCCP0 (power), J2 GND (power), J3 BK6_IO1, J4 BK6_IO0, J7 GND (power), J8 GND (power), J9 GND (power), J10 GND (power), J13 BK1_IO15 / CLK_OUT2, J14 BK1_IO14, J15 GND (power), J16 VCCP1 (power), K1 BK6_IO2, K2 BK6_IO3, K3 BK6_IO5, K4 BK6_IO4, K7 GND (power), K8 GND (power), K9 GND (power), K10 GND (power), K13 BK1_IO11, K14 BK1_IO10, K15 BK1_IO12, K16 SEL2, L1 BK6_IO6, L2 BK6_IO7, L3 BK6_IO12, L4 VCCO6 (power), L13 VCCO1 (power), L14 BK1_IO3, L15 BK1_IO7, L16 BK1_IO13, M1 VCCO6 (power), M2 BK6_IO9, M3 BK6_IO11, M4 BK6_IO10, M13 BK1_IO5, M14 BK1_IO4, M15 BK1_IO6, M16 VCCO1 (power), N1 BK6_IO8, N2 BK6_IO13, N3 TDI, N4 GND (power), N5 BK7_IO4, N6 VCCO7 (power), N7 BK7_IO10, N8 GCLK/CE2, N9 GCLK/CE3, N10 BK0_IO5, N11 VCCO0 (power), N12 BK0_IO11, N13 GND (power), N14 BK1_IO0 / VREF1, N15 BK1_IO2, N16 BK1_IO9, P1 BK6_IO14, P2 BK6_IO15 / VREF6, P3 VCC (power), P4 BK7_IO2, P5 BK7_IO5, P6 BK7_IO9, P7 BK7_IO11, P8 TOE, P9 BK0_IO0, P10 BK0_IO4, P11 BK0_IO8, P12 BK0_IO10, P13 BK0_IO15 / VREF0, P14 VCCJ (power), P15 BK1_IO1, P16 BK1_IO8, R1 TMS, R2 VCC (power), R3 BK7_IO1, R4 BK7_IO6, R5 BK7_IO8, R6 BK7_IO12, R7 BK7_IO14, R8 GND (power), R9 GND (power), R10 BK0_IO2 / PLL_LOCK2 / PLL_RST2, R11 BK0_IO6, R12 BK0_IO9 / PLL_FB2, R13 BK0_IO13, R14 TCK, R15 VCC (power), R16 TDO, T1 GND (power), T2 BK7_IO0 / VREF7, T3 BK7_IO3, T4 BK7_IO7, T5 VCCO7 (power), T6 BK7_IO13, T7 BK7_IO15, T8 GOE0, T9 GOE3, T10 BK0_IO1, T11 BK0_IO3, T12 VCCO0 (power), T13 BK0_IO7, T14 BK0_IO12, T15 BK0_IO14, T16 GND (power)